# Altium footprint library lib_PCB.PcbLib: 392 footprints (part 25 of 25)
Each footprint in its own frame and in the unit in brackets; x right, y up, seen from the top. Pads: shape width x height; smd on the part's side, far side on the other; paste and mask are expansions set on the pad; w line width, h text height; cw(c..) or ccw(c..) is an arc to the next point about the centre after c.
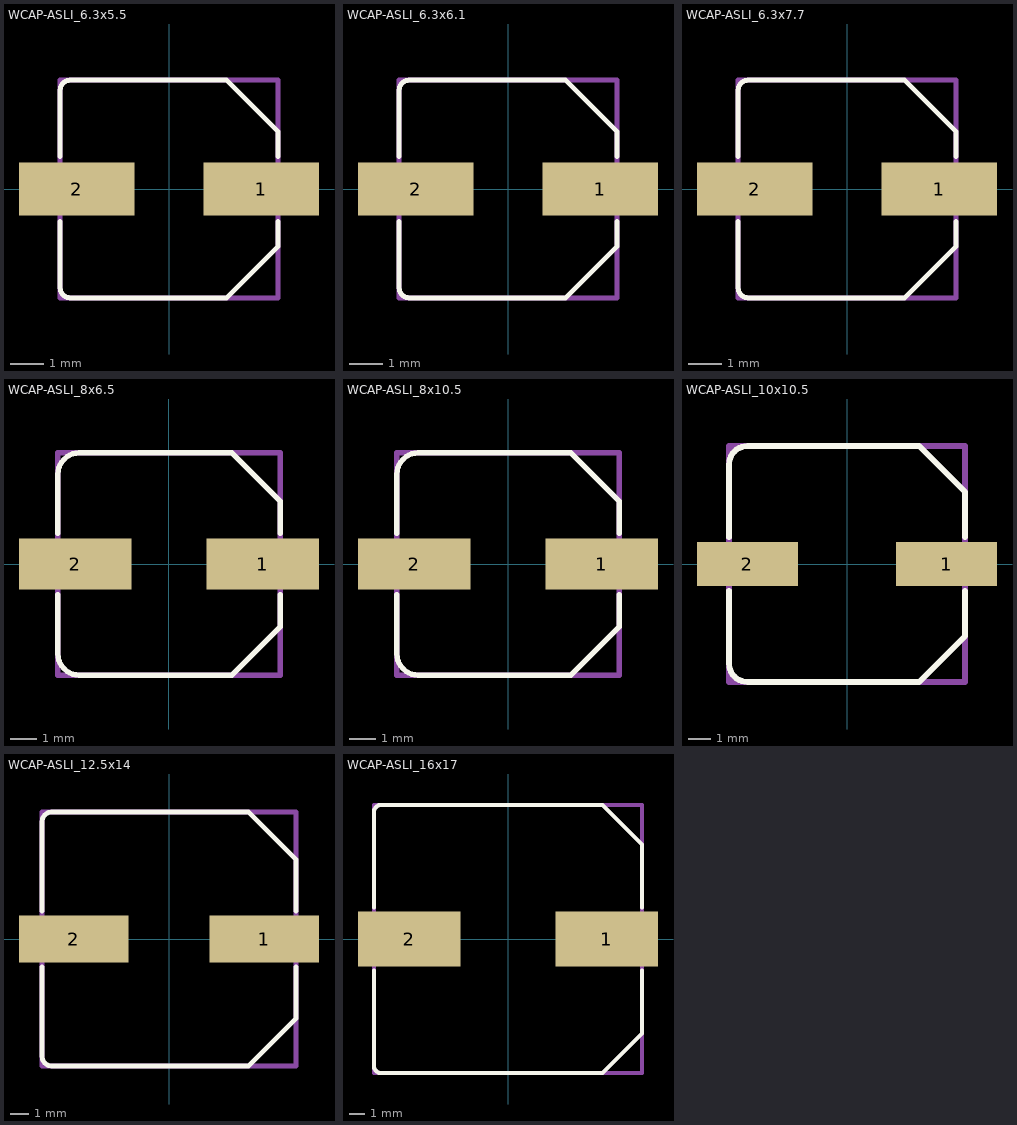
[diagram p24: the footprints below, top view; thin cyan lines are the x and y axes]

## WCAP-ASLI_6.3x5.5 [mm] "Aluminium Electrolytic V-Chip SMT Capacitors, Ф6.3x5.5mm"
height 5.5
pads (2):
  rect 3.5x1.6 smd: 1(2.8,0) 2(-2.8,0)
Top Overlay:
  lines w0.15: -3.3,-3 ccw(c-3,-3) -3,-3.3 1.75,-3.3 3.3,-1.75 3.3,-0.98 ; -3.3,-2.99 -3.3,-0.98 ; -3.3,0.98 -3.3,2.99 ; -3.3,3 cw(c-3,3) -3,3.3 1.75,3.3 3.3,1.75 3.3,0.98
Mechanical 13:
  lines w0.15: -3.3,-3.3 -3.3,3.3 3.3,3.3 3.3,-3.3 -3.3,-3.3
3D body "6.3x5.5x2.2.stp": height 5.5, standoff 0, extent -3.65,-3.3 3.65,3.3

## WCAP-ASLI_6.3x6.1 [mm] "Aluminium Electrolytic V-Chip SMT Capacitors, Ф6.3x6.1mm"
height 6.1
pads (2):
  rect 3.5x1.6 smd: 1(2.8,0) 2(-2.8,0)
Top Overlay:
  lines w0.15: -3.3,-3 ccw(c-3,-3) -3,-3.3 1.75,-3.3 3.3,-1.75 3.3,-0.98 ; -3.3,-2.99 -3.3,-0.98 ; -3.3,0.98 -3.3,2.99 ; -3.3,3 cw(c-3,3) -3,3.3 1.75,3.3 3.3,1.75 3.3,0.98
Mechanical 13:
  lines w0.15: -3.3,-3.3 3.3,-3.3 3.3,3.3 -3.3,3.3 -3.3,-3.3
3D body "6.3x6.1x2.2.stp": height 6.1, standoff 0, extent -3.65,-3.3 3.65,3.3

## WCAP-ASLI_6.3x7.7 [mm] "Aluminium Electrolytic V-Chip SMT Capacitors, Ф6.3x7.7mm"
height 7.7
pads (2):
  rect 3.5x1.6 smd: 1(2.8,0) 2(-2.8,0)
Top Overlay:
  lines w0.15: -3.3,-3 ccw(c-3,-3) -3,-3.3 1.75,-3.3 3.3,-1.75 3.3,-0.98 ; -3.3,-2.99 -3.3,-0.98 ; -3.3,0.98 -3.3,2.99 ; -3.3,3 cw(c-3,3) -3,3.3 1.75,3.3 3.3,1.75 3.3,0.98
Mechanical 13:
  lines w0.15: -3.3,-3.3 -3.3,3.3 3.3,3.3 3.3,-3.3 -3.3,-3.3
3D body "6.3x7.7x2.2.stp": height 7.7, standoff 0, extent -3.65,-3.3 3.65,3.3

## WCAP-ASLI_8x6.5 [mm] "Aluminium Electrolytic V-Chip SMT Capacitors, Ф8x6.5mm"
height 6.5
pads (2):
  rect 4.2x1.9 smd: 1(3.5,0) 2(-3.5,0)
Top Overlay:
  lines w0.2: -4.15,-1.15 -4.15,-3.35 ccw(c-3.35,-3.35) -3.35,-4.15 2.35,-4.15 4.15,-2.35 4.15,-1.15 ; -4.15,1.15 -4.15,3.35 cw(c-3.35,3.35) -3.35,4.15 2.35,4.15 4.15,2.35 4.15,1.15
Mechanical 13:
  lines w0.2: -4.15,-4.15 4.15,-4.15 4.15,4.15 -4.15,4.15 -4.15,-4.15
3D body "8x6.5x2.3.stp": height 6.53, standoff 0.03, extent -4.5,-4.15 4.5,4.15

## WCAP-ASLI_8x10.5 [mm] "Aluminium Electrolytic V-Chip SMT Capacitors, Ф8x10.5mm"
height 10.5
pads (2):
  rect 4.2x1.9 smd: 1(3.5,0) 2(-3.5,0)
Top Overlay:
  lines w0.2: -4.15,-1.15 -4.15,-3.35 ccw(c-3.35,-3.35) -3.35,-4.15 2.35,-4.15 4.15,-2.35 4.15,-1.15 ; -4.15,1.15 -4.15,3.35 cw(c-3.35,3.35) -3.35,4.15 2.35,4.15 4.15,2.35 4.15,1.15
Mechanical 13:
  lines w0.2: -4.15,-4.15 -4.15,4.15 4.15,4.15 4.15,-4.15 -4.15,-4.15
3D body "8x10.5x3.1.stp": height 10.5, standoff 0, extent -4.5,-4.15 4.5,4.15

## WCAP-ASLI_10x10.5 [mm] "Aluminium Electrolytic V-Chip SMT Capacitors, Ф10x10.5mm"
height 10.5
pads (2):
  rect 4.4x1.9 smd: 1(4.35,0) 2(-4.35,0)
Top Overlay:
  lines w0.254: -5.15,-1.17 -5.15,-4.35 ccw(c-4.35,-4.35) -4.35,-5.15 3.15,-5.15 5.15,-3.15 5.15,-1.18 ; -5.15,1.17 -5.15,4.35 cw(c-4.35,4.35) -4.35,5.15 3.15,5.15 5.15,3.15 5.15,1.18
Mechanical 13:
  lines w0.254: -5.15,-5.15 -5.15,5.15 5.15,5.15 5.15,-5.15 -5.15,-5.15
3D body "10x10.5x4.5.stp": height 10.5, standoff 0, extent -5.5,-5.15 5.5,5.15

## WCAP-ASLI_12.5x14 [mm] "Aluminium Electrolytic V-Chip SMT Capacitors, Ф12.5x14mm"
height 14
pads (2):
  rect 5.8x2.5 smd: 1(5.05,0) 2(-5.05,0)
Top Overlay:
  lines w0.254: -6.725,-1.475 -6.725,-6.225 ccw(c-6.225,-6.225) -6.225,-6.725 4.225,-6.725 6.725,-4.225 6.725,-1.485 ; -6.725,1.475 -6.725,6.225 cw(c-6.225,6.225) -6.225,6.725 4.225,6.725 6.725,4.225 6.725,1.485
Mechanical 13:
  lines w0.254: -6.725,-6.725 -6.725,6.725 6.725,6.725 6.725,-6.725 -6.725,-6.725
3D body "12.5x14x4.5.stp": height 14, standoff 0, extent -7.1,-6.725 7.1,6.725

## WCAP-ASLI_16x17 [mm] "Aluminium Electrolytic V-Chip SMT Capacitors, Ф16x17mm"
height 17
pads (2):
  rect 6.5x3.5 smd: 1(6.25,0) 2(-6.25,0)
Top Overlay:
  lines w0.254: -8.5,-1.99 -8.5,-8 ccw(c-8,-8) -8,-8.5 6,-8.5 8.5,-6 8.5,-1.98 ; -8.5,1.99 -8.5,8 cw(c-8,8) -8,8.5 6,8.5 8.5,6 8.5,1.98
Mechanical 13:
  lines w0.254: -8.5,-8.5 8.5,-8.5 8.5,8.5 -8.5,8.5 -8.5,-8.5
3D body "16x17x7_new.stp": height 17, standoff 0, extent -9.15,-8.5 9.15,8.5